# Altium footprint library THU.PcbLib: 477 footprints (part 13 of 30)
Each footprint in its own frame and in the unit in brackets; x right, y up, seen from the top. Pads: shape width x height; smd on the part's side, far side on the other; paste and mask are expansions set on the pad; w line width, h text height; cw(c..) or ccw(c..) is an arc to the next point about the centre after c.
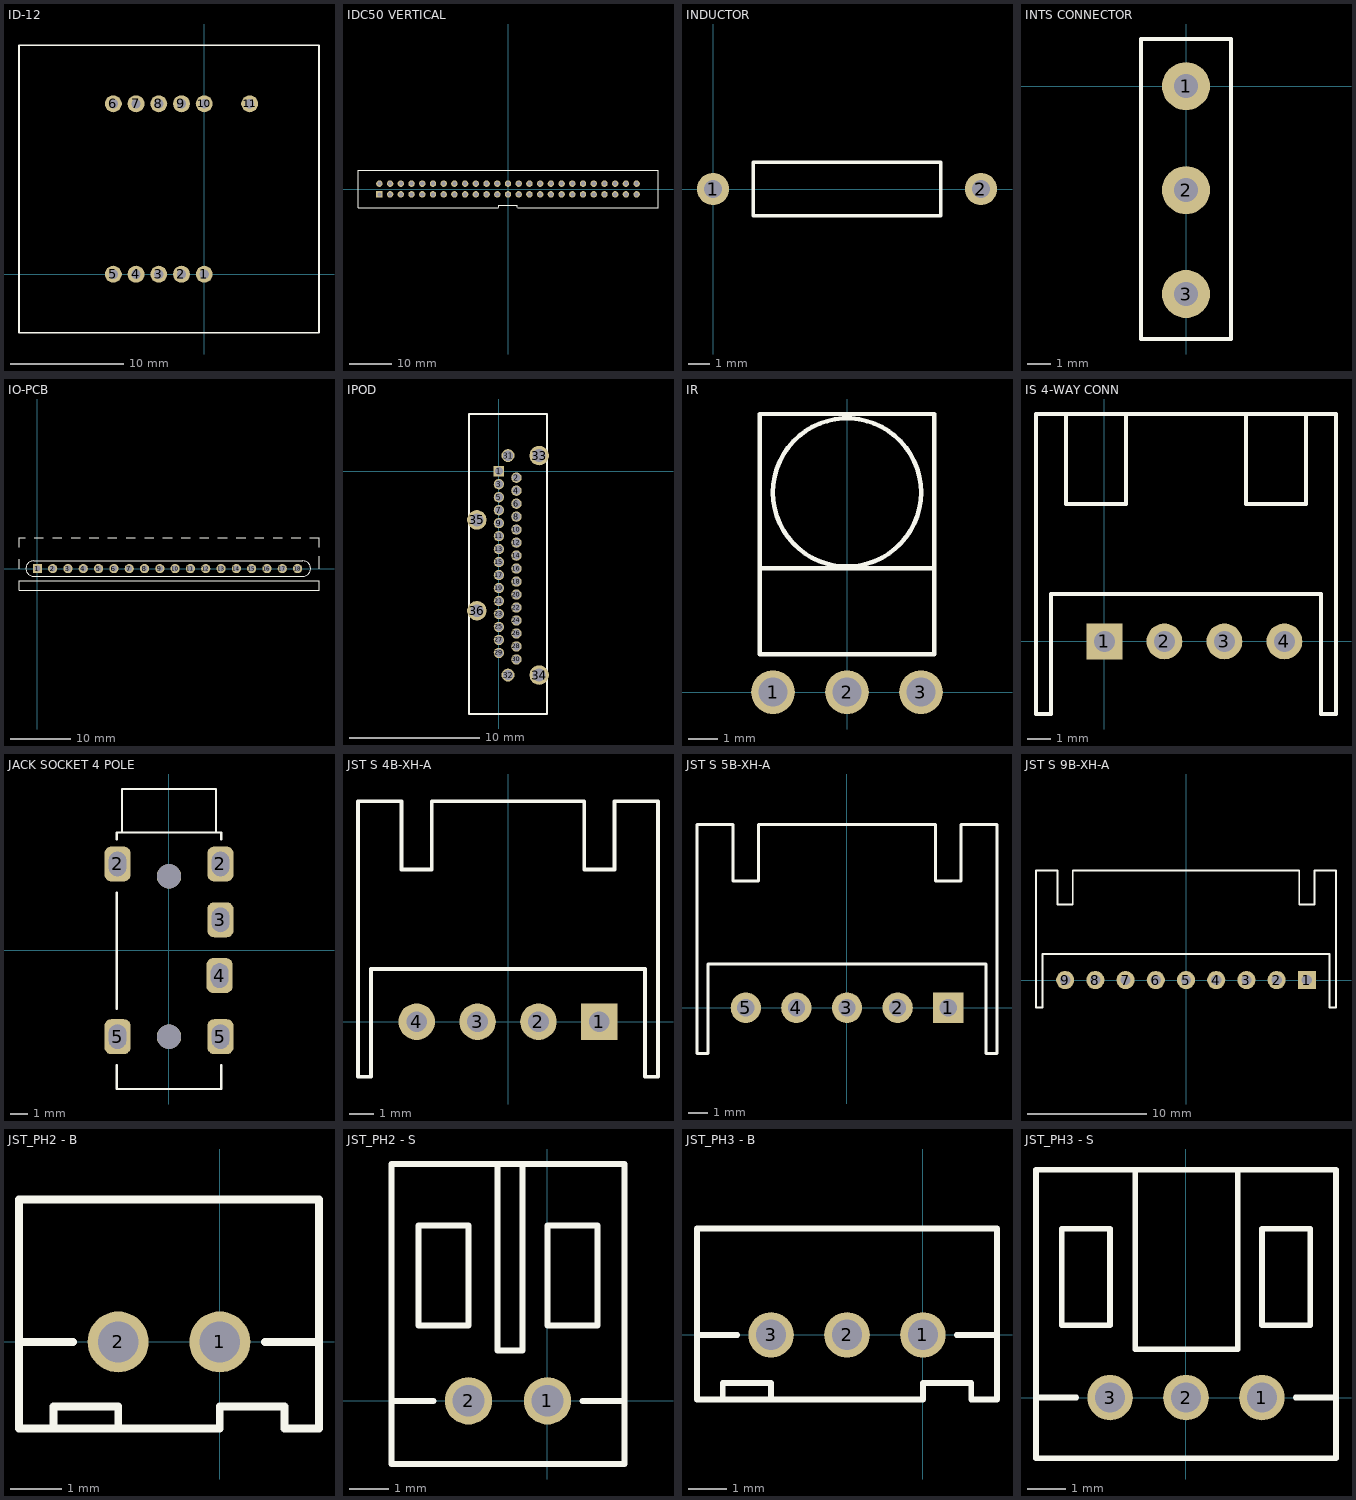
[diagram p12: the footprints below, top view; thin cyan lines are the x and y axes]

## ID-12 [mm] "RF READER"
height 6
pads (11):
  round 1.5 hole 0.8: 1(0,0) 2(-2,0) 3(-4,0) 4(-6,0) 5(-8,0) 6(-8,15) 7(-6,15) 8(-4,15) 9(-2,15) 10(0,15) 11(4,15)
TopOverlay:
  lines w0.152: -16.3,-5.15 -16.3,20.15 10.1,20.15 10.1,-5.15 -16.3,-5.15

## IDC50 VERTICAL [mil] "50WAY ICD BOX HEADER"
height 358.27
pads (50):
  rect 60x60 hole 38: 1(-1200,-50)
  round 60 hole 38: 2(-1200,50) 3(-1100,-50) 4(-1100,50) 5(-1000,-50) 6(-1000,50) 7(-900,-50) 8(-900,50) 9(-800,-50) 10(-800,50) 11(-700,-50) 12(-700,50) 13(-600,-50) 14(-600,50) 15(-500,-50) 16(-500,50) 17(-400,-50) 18(-400,50) 19(-300,-50) 20(-300,50) 21(-200,-50) 22(-200,50) 23(-100,-50) 24(-100,50) 25(0,-50) 26(0,50) 27(100,-50) 28(100,50) 29(200,-50) 30(200,50) 31(300,-50) 32(300,50) 33(400,-50) 34(400,50) 35(500,-50) 36(500,50) 37(600,-50) 38(600,50) 39(700,-50) 40(700,50) 41(800,-50) 42(800,50) 43(900,-50) 44(900,50) 45(1000,-50) 46(1000,50) 47(1100,-50) 48(1100,50) 49(1200,-50) 50(1200,50)
TopOverlay:
  lines w6: -90,-173.23 -1399.61,-173.23 -1399.61,173.23 0,173.23 1399.61,173.23 1399.61,-173.23 90,-173.23 ; -88.58,-171.81 -88.58,-150 88.58,-150 88.58,-171.81

## INDUCTOR [mil]
pads (2):
  round 60 hole 34: 1(0,0) 2(500,0)
TopOverlay:
  lines w6: 75,-50 75,50 425,50 425,-50 75,-50

## INTS CONNECTOR [mil]
pads (3):
  round 80 hole 40: 1(0,0) 2(0,-173.23) 3(0,-346.46)
TopOverlay:
  lines w6: -75,-421.46 -75,78.54 75,78.54 75,-421.46 -75,-421.46

## IO-PCB [mil]
pads (18):
  rect 60x60 hole 39: 1(0,0)
  round 60 hole 39: 2(100,0) 3(200,0) 4(300,0) 5(400,0) 6(500,0) 7(600,0) 8(700,0) 9(800,0) 10(900,0) 11(1000,0) 12(1100,0) 13(1200,0) 14(1300,0) 15(1400,0) 16(1500,0) 17(1600,0) 18(1700,0)
TopOverlay:
  lines w6: -120,0 -120,60 ; -80,200 -120,200 ; -20,200 40,200 ; 100,200 160,200 ; 220,200 280,200 ; 340,200 400,200 ; 460,200 520,200 ; 580,200 640,200 ; 700,200 760,200 ; 820,200 880,200 ; 940,200 1000,200 ; 1060,200 1120,200 ; 1180,200 1240,200 ; 1300,200 1360,200 ; 1420,200 1480,200 ; 1540,200 1600,200 ; 1660,200 1720,200 ; 1780,200 1840,200 1840,140 ; 1840,0 1840,80 ; -120,200 -120,140 -120,200 ; -120,-140 1840,-140 1840,-80 -120,-80 -120,-140 ; -25,-50 cw(c-25,0) -25,50 1735,50 cw(c1735,0) 1735,-50 -25,-50

## IPOD [mm]
pads (36):
  rect 0.8x0.8 hole 0.6: 1(0,0)
  round 0.8 hole 0.6: 2(1.35,-0.5) 3(0,-1) 4(1.35,-1.5) 5(0,-2) 6(1.35,-2.5) 7(0,-3) 8(1.35,-3.5) 9(0,-4) 10(1.35,-4.5) 11(0,-5) 12(1.35,-5.5) 13(0,-6) 14(1.35,-6.5) 15(0,-7) 16(1.35,-7.5) 17(0,-8) 18(1.35,-8.5) 19(0,-9) 20(1.35,-9.5) 21(0,-10) 22(1.35,-10.5) 23(0,-11) 24(1.35,-11.5) 25(0,-12) 26(1.35,-12.5) 27(0,-13) 28(1.35,-13.5) 29(0,-14) 30(1.35,-14.5)
  round 1 hole 0.8: 31(0.7,1.2) 32(0.7,-15.7)
  round 1.5 hole 1: 33(3.1,1.2) 34(3.1,-15.7) 35(-1.7,-3.75) 36(-1.7,-10.75)
TopOverlay:
  lines w0.152: -2.3,-18.7 3.7,-18.7 3.7,4.4 0.7,4.4 -2.3,4.4 -2.3,-18.7

## IR [mm] "IR SIDE MOUNTED"
height 3.9
pads (3):
  round 1.5 hole 1: 1(-2.54,0) 2(0,0) 3(2.54,0)
TopOverlay:
  circle w0.152: c0,6.858 r2.543
  lines w0.152: -3,4.25 3,4.25 ; -3,1.3 3,1.3 3,9.55 -3,9.55 -3,1.3
3D body: height 3.9, standoff 0, extent -3,1.3 3,9.55
3D body: height 5.5, standoff 0.5, extent -2.489,4.253 2.5,9.247
3D body: height 1.35, standoff 1.3, extent -2.75,0 -2.25,1.25
3D body: height 1.3, standoff -1, extent -2.75,0 -2.25,0.25
3D body: height 1.3, standoff -1, extent -0.25,0 0.25,0.25
3D body: height 1.35, standoff 1.3, extent -0.25,0 0.25,1.25
3D body: height 1.3, standoff -1, extent 2.29,0 2.79,0.25
3D body: height 1.35, standoff 1.3, extent 2.29,0 2.79,1.25

## IS 4-WAY CONN [mil]
pads (4):
  rect 60x60 hole 35: 1(0,0)
  round 60 hole 35: 2(100,0) 3(200,0) 4(300,0)
TopOverlay:
  lines w6: -64,379 -64,229 36,229 36,379 ; 236,379 236,229 336,229 336,379 ; -114,-121 -114,379 386,379 386,-121 361,-121 361,79 -89,79 -89,-121 -114,-121

## JACK SOCKET 4 POLE [mm] "3.5mm 4 Pole Jack Socket  MC001296"
pads (8):
  rrect50% 1.5x2 hole 1 slot 1.4 at 90 deg: 2(-2.95,4.95) 2(2.95,4.95) 3(2.95,1.75) 4(2.9,-1.45) 5(-2.95,-4.95) 5(2.95,-4.95)
  round 1.4 hole 1.4 unplated: ""(0,-4.95) ""(0,4.25)
TopOverlay:
  lines w0.127: -3,-6.585 -3,-7.95 0,-7.95 3,-7.95 3,-6.585 ; -3,-3.362 -3,3.321 ; -3,6.369 -3,6.75 0,6.75 3,6.75 3,6.369 ; -2.7,6.75 -2.7,9.25 0,9.25 2.7,9.25 2.7,6.75

## JST S 4B-XH-A [mil] "S4B-PH-K-S (LF)(SN)"
height 240.16
pads (4):
  rect 60x60 hole 34: 1(150,0)
  round 60 hole 34: 2(50,0) 3(-50,0) 4(-150,0)
TopOverlay:
  lines w6: -246.46,-90.55 -246.46,362.2 -175,362.2 -175,250 -125,250 -125,362.2 125,362.2 125,250 175,250 175,362.2 246.46,362.2 246.46,-90.55 225,-90.55 225,86.61 -225,86.61 -225,-90.55 -246.46,-90.55
3D body "S4B-XH-A.STEP": height 242.13, standoff -133.86, extent -244.1,-90.38 244.1,362.38

## JST S 5B-XH-A [mil] "S5B-PH-K-S (LF)(SN)"
height 240.16
pads (5):
  rect 60x60 hole 34: 1(200,0)
  round 60 hole 34: 2(100,0) 3(0,0) 4(-100,0) 5(-200,0)
TopOverlay:
  lines w6: -296.46,-90.55 -296.46,362.2 -225,362.2 -225,250 -175,250 -175,362.2 175,362.2 175,250 225,250 225,362.2 296.46,362.2 296.46,-90.55 275,-90.55 275,86.61 -275,86.61 -275,-90.55 -296.46,-90.55

## JST S 9B-XH-A [mil] "S9B-XH-A (LF)(SN)"
height 240.16
pads (9):
  rect 60x60 hole 34: 1(400,0)
  round 60 hole 34: 2(300,0) 3(200,0) 4(100,0) 5(0,0) 6(-100,0) 7(-200,0) 8(-300,0) 9(-400,0)
TopOverlay:
  lines w6: -496.46,-90.55 -496.46,362.2 -425,362.2 -425,250 -375,250 -375,362.2 375,362.2 375,250 425,250 425,362.2 496.46,362.2 496.46,-90.55 475,-90.55 475,86.61 -475,86.61 -475,-90.55 -496.46,-90.55

## JST_PH2 - B [mm] "B 2B-PH-K-S"
pads (2):
  round 1.2 hole 0.8: 1(0,0) 2(-2,0)
TopOverlay:
  lines w0.152: -3.95,0 -2.889,0 ; -3.27,-1.7 -3.27,-1.27 -2,-1.27 -2,-1.7 ; 0.889,0 1.95,0 ; -3.95,-1.7 -3.95,2.8 1.95,2.8 1.95,-1.7 1.27,-1.7 1.27,-1.27 0,-1.27 0,-1.7 -3.95,-1.7
3D body "B2B-PH-K-S.STEP": height 6, standoff -3.4, extent -3.966,-1.706 1.934,2.794

## JST_PH2 - S [mm] "S 2B-PH-K-S"
height 4.5
pads (2):
  round 1.2 hole 0.8: 1(0,0) 2(-2,0)
TopOverlay:
  lines w0.152: -3.95,0 -2.889,0 ; -1.27,6 -1.27,1.27 -0.635,1.27 -0.635,6 ; 0.889,0 1.95,0 ; -3.95,-1.6 1.95,-1.6 1.95,6 -3.95,6 -3.95,-1.6 ; -3.27,1.905 -3.27,4.445 -2,4.445 -2,1.905 -3.27,1.905 ; 0,1.905 0,4.445 1.27,4.445 1.27,1.905 0,1.905
3D body "S2B-PH-K-S.STEP": height 4.83, standoff -3.37, extent -3.966,-1.352 1.934,6.248

## JST_PH3 - B [mm] "B 3B-PH-K-S"
pads (3):
  round 1.2 hole 0.8: 1(0,0) 2(-2,0) 3(-4,0)
TopOverlay:
  lines w0.152: -5.95,0 -4.889,0 ; -5.27,-1.7 -5.27,-1.27 -4,-1.27 -4,-1.7 ; 0.889,0 1.95,0 ; -5.95,-1.7 -5.95,2.8 1.95,2.8 1.95,-1.7 1.27,-1.7 1.27,-1.27 0,-1.27 0,-1.7 -5.95,-1.7
3D body "B3B-PH-K-S.STEP": height 6, standoff -3.4, extent -5.925,-1.675 1.975,2.825

## JST_PH3 - S [mm] "S 3B-PH-K-S"
height 4.5
pads (3):
  round 1.2 hole 0.8: 1(2,0) 2(0,0) 3(-2,0)
TopOverlay:
  lines w0.152: -3.95,0 -2.889,0 ; -1.334,6 -1.334,1.27 1.365,1.27 1.365,6 ; 2.889,0 3.95,0 ; -3.95,-1.6 3.95,-1.6 3.95,6 -3.95,6 -3.95,-1.6 ; -3.27,1.905 -3.27,4.445 -2,4.445 -2,1.905 -3.27,1.905 ; 2,1.905 2,4.445 3.27,4.445 3.27,1.905 2,1.905
3D body "S3B-PH-K-S.STEP": height 4.83, standoff -3.37, extent -3.95,-1.321 3.95,6.279